# Altium schematic symbol library BARKO_SCHLIB.SchLib: 1064 symbols (part 7 of 11) (continued)
## L-1u1H-7050-744314110
designator L?, comment 1u1H  Max DC Current: 15A
INDUCTOR, POWER, 1.1UH, 20%, 7.3X7.2MM; Manufacturer: Wurth Electronics; Manufacturer Part Number: 744314110; Self Resonant Frequency: 135MHz; Saturation Current: 13A; Shielding: Shielded; DC Resistance (DCR): 3.15mR; Test Frequency: 100kHz; Series Resistance: 3.15R; .Creator: M.OZKAN; .PCBCHK: USED; Supplier 1: Digi-Key; Supplier Part Number 1: 732-1157-1-ND; Stock: 6291; Pricing: 1=3.56, 10=3.494, 50=3.226, 100=3.091, 500=2.89 (USD); RoHS: Yes; Mount: Surface Mount; Case/Package: Nonstandard; Min Operating Temperature: -40°C; Max Operating Temperature: 150°C; Tolerance: 20%; Package Quantity: 1; Current Rating: 15A; Packaging: Tape and Reel; Inductance Tolerance: 20%; Composition: Wirewound; Inductance: 1.1uH; Termination: SMD/SMT; RMS Current (Irms): 15A; Length: 0.272inch; Height: 4.8mm; Width: 6.9mm; Height - Seated (Max): 0.197inch; REACH SVHC: Unknown; Lead Free: Lead Free; ComponentLink1URL: https://datasheet.ciiva.com/1052/744314110-1052001.pdf?src-supplier=Digi-Key; ComponentLink1Description: https://datasheet.ciiva.com/1052/744314110-1052001.pdf?src-supplier=Digi-Key; ComponentLink2URL: https://datasheet.ciiva.com/23782/1645941-23782470.pdf?src-supplier=Newark; ComponentLink2Description: https://datasheet.ciiva.com/23782/1645941-23782470.pdf?src-supplier=Newark; ComponentLink3URL: https://datasheet.ciiva.com/4954/744314110-26271-4954696.pdf?src-supplier=Mouser; ComponentLink3Description: https://datasheet.ciiva.com/4954/744314110-26271-4954696.pdf?src-supplier=Mouser; ComponentLink4URL: https://datasheet.ciiva.com/7765/1735761-7765021.pdf?src-supplier=Element14; ComponentLink4Description: https://datasheet.ciiva.com/7765/1735761-7765021.pdf?src-supplier=Element14; ComponentLink5URL: https://datasheet.ciiva.com/1052/744314110-1052002.pdf?src-supplier=Digi-Key; ComponentLink5Description: https://datasheet.ciiva.com/1052/744314110-1052002.pdf?src-supplier=Digi-Key; ComponentLink6URL: https://datasheet.ciiva.com/1052/744314110-1052003.pdf?src-supplier=Digi-Key; ComponentLink6Description: https://datasheet.ciiva.com/1052/744314110-1052003.pdf?src-supplier=Digi-Key; .SCHCHK: USED
footprint L-WE-HCI-7050 (SMD Inductor, 2-Leads, Body 7.0 x 6.9 mm)
pins: 1, 2

## L-1uH-0420CDMCCDS-1R0MC
designator L?, comment Inductance: 1uH  Case/Package: 1616  Current Rating: 4A  (hidden comment: 0420CDMCCDS-1R0MC)
FIXED IND 1UH 6.5A 27 MOHM; Manufacturer: Vishay Dale; Manufacturer Part Number: IHLP1616ABER1R0M01; Core Material: Metal,Composite,Ferrite; Saturation Current: 7A; Tolerance: 20%; Shielding: Shielded; Self Resonant Frequency: 64MHz; DC Resistance (DCR): 52.5mR; Test Frequency: 100kHz; Max DC Current: 8.5A; Washability: OK; .Creator: M.OZKAN; .PCBCHK: USED; ComponentLink1URL: http://products.sumida.com/products/pdf/0420CDMCCDS1.pdf?src-supplier=Digi-Key; ComponentLink1Description: http://products.sumida.com/products/pdf/0420CDMCCDS1.pdf?src-supplier=Digi-Key; Supplier 1: Digi-Key; Supplier Part Number 1: 541-1043-1-ND; Stock 1: 7197; Pricing 1: 1=2.62000, 10=2.41500, 100=1.69050, 500=1.36850, 1000=1.24775 (USD); RoHS: Yes; Mount: Surface Mount; Number of Pins: 1616; Case Code (Metric): 4040; Case Code (Imperial): 1616; Contact Plating: Tin; Min Operating Temperature: -55°C; Max Operating Temperature: 125°C; Package Quantity: 4000; Packaging: Tape and Reel; Inductance Tolerance: 20%; Termination: SMD/SMT; Military Standard: Not; RMS Current (Irms): 4A; Length: 4.7mm; Height: 1.2mm; Width: 0.16inch; Height - Seated (Max): 0.047inch; Depth: 4.31mm; Radiation Hardening: No; REACH SVHC: Unknown; Lead Free: Lead Free; ComponentLink2URL: https://datasheet.ciiva.com/1051/lp16ab01-1051920.pdf?src-supplier=Digi-Key; ComponentLink2Description: https://datasheet.ciiva.com/1051/lp16ab01-1051920.pdf?src-supplier=Digi-Key; ComponentLink3URL: https://datasheet.ciiva.com/3866/lp16ab01-3866741.pdf?src-supplier=Arrow; ComponentLink3Description: https://datasheet.ciiva.com/3866/lp16ab01-3866741.pdf?src-supplier=Arrow; ComponentLink4URL: https://datasheet.ciiva.com/7290/1748910-7290133.pdf?src-supplier=Newark; ComponentLink4Description: https://datasheet.ciiva.com/7290/1748910-7290133.pdf?src-supplier=Newark; ComponentLink5URL: https://datasheet.ciiva.com/11798/0900766b8102b52a-11798309.pdf?src-supplier=RSComponents; ComponentLink5Description: https://datasheet.ciiva.com/11798/0900766b8102b52a-11798309.pdf?src-supplier=RSComponents; ComponentLink6URL: https://datasheet.ciiva.com/1051/lp16ab01-1051921.pdf?src-supplier=Digi-Key; ComponentLink6Description: https://datasheet.ciiva.com/1051/lp16ab01-1051921.pdf?src-supplier=Digi-Key; ComponentLink7URL: https://datasheet.ciiva.com/1051/lp16ab01-1051922.pdf?src-supplier=Digi-Key; ComponentLink7Description: https://datasheet.ciiva.com/1051/lp16ab01-1051922.pdf?src-supplier=Digi-Key; ComponentLink8URL: https://datasheet.ciiva.com/46430/1856027-46430119.pdf?src-supplier=Element14; ComponentLink8Description: https://datasheet.ciiva.com/46430/1856027-46430119.pdf?src-supplier=Element14; ComponentLink9URL: https://datasheet.ciiva.com/7649/425543-7649737.pdf?src-supplier=Element14; ComponentLink9Description: https://datasheet.ciiva.com/7649/425543-7649737.pdf?src-supplier=Element14; ComponentLink10URL: https://datasheet.ciiva.com/17269/lp16ab01-17269641.pdf?src-supplier=Avnet+Europe; ComponentLink10Description: https://datasheet.ciiva.com/17269/lp16ab01-17269641.pdf?src-supplier=Avnet+Europe; ComponentLink11URL: https://datasheet.ciiva.com/17111/70205424-17111707.pdf?src-supplier=Allied+Electronics; ComponentLink11Description: https://datasheet.ciiva.com/17111/70205424-17111707.pdf?src-supplier=Allied+Electronics; .SCHCHK: USED
footprint L-IHLP1616
pins: 1, 2

## L-1uH-IHLP1616BZER1R0M01
designator L?  Inductance: 1uH  Saturation Current: 8.5A  Case/Package: 1616  (hidden comment: *)
FIXED IND 1UH 3.75A 37 MOHM SMD; Manufacturer: Vishay Dale; Manufacturer Part Number: IHLP1616BZER1R0M01; Core Material: Composite,Ferrite,Metal; Tolerance: 20%; DC Resistance (DCR): 37mR; Self Resonant Frequency: 90MHz; Shielding: Shielded; Test Frequency: 100kHz; .PCBCHK: USED; .Creator: F:TALI; Washability: OK; Supplier 1: Digi-Key; Supplier Part Number 1: 541-1047-6-ND; Stock 1: 11650; Pricing 1: 1=2.65, 10=2.45, 100=1.7147, 500=1.38806, 1000=1.26558 (USD); Mount: Surface Mount; Number of Pins: 2; Contact Plating: Tin; Min Operating Temperature: -55°C; Max Operating Temperature: 125°C; Inductance Tolerance: 20%; Packaging: Tape and Reel; Package Quantity: 1; Termination: SMD/SMT; Military Standard: Not; RMS Current (Irms): 3.75A; Length: 4.7mm; Height: 2mm; Depth: 4.31mm; Width: 4.06mm; Height - Seated (Max): 0.079inch; Radiation Hardening: No; REACH SVHC: Unknown; Lead Free: Lead Free; ComponentLink1URL: http://www.farnell.com/datasheets/425556.pdf; ComponentLink1Description: http://www.farnell.com/datasheets/425556.pdf; ComponentLink2URL: http://www.vishay.com/docs/34195/lp16bz01.pdf; ComponentLink2Description: http://www.vishay.com/docs/34195/lp16bz01.pdf; ComponentLink3URL: http://uk.rs-online.com/webdocs/102c/0900766b8102c92b.pdf; ComponentLink3Description: http://uk.rs-online.com/webdocs/102c/0900766b8102c92b.pdf; Current Rating: 3.75A; Max DC Current: 8.5A; .SCHCHK: USED
footprint L-IHLP1616
pins: 1, 2

## L-1uH-IHLP2020BZER1R0M01
designator L?, comment IHLP2020BZER1R0M01  Max DC Current: 16A  Case/Package: 2020
FIXED IND 1UH 7A 20 MOHM SMD; Manufacturer: Vishay Dale; Core Material: Composite,Ferrite,Metal; Tolerance: 20%; DC Resistance (DCR): 20mR; Shielding: Shielded; Self Resonant Frequency: 62MHz; Test Frequency: 100kHz; .Creator: F:TALI; .PCBCHK: USED; Washability: OK; Supplier 1: Digi-Key; Manufacturer Part Number: IHLP2020BZER1R0M01; Stock 1: 88778; Pricing 1: 1=2.39, 10=2.208, 100=1.5456, 500=1.2512, 1000=1.1408 (USD); Mount: Surface Mount; Number of Pins: 2020; Contact Plating: Tin; Min Operating Temperature: -55°C; Max Operating Temperature: 125°C; Inductance: 1uH; Package Quantity: 2000; Current Rating: 7A; Saturation Current: 16A; Packaging: Tape and Reel; Inductance Tolerance: 20%; Termination: SMD/SMT; Military Standard: Not; RMS Current (Irms): 7A; Length: 5.74mm; Height: 2mm; Depth: 5.43mm; Width: 0.204inch; Height - Seated (Max): 0.079inch; Radiation Hardening: No; REACH SVHC: Unknown; Lead Free: Lead Free; ComponentLink1URL: http://uk.rs-online.com/webdocs/102c/0900766b8102c92d.pdf?src-supplier=RSComponents; ComponentLink1Description: http://uk.rs-online.com/webdocs/102c/0900766b8102c92d.pdf?src-supplier=RSComponents; ComponentLink2URL: http://www.mouser.com/ds/2/427/ihlp-2020bz-01-270737.pdf?src-supplier=Mouser; ComponentLink2Description: http://www.mouser.com/ds/2/427/ihlp-2020bz-01-270737.pdf?src-supplier=Mouser; ComponentLink3URL: http://www.vishay.com/docs/34253/lp20bz01.pdf?src-supplier=Avnet; ComponentLink3Description: http://www.vishay.com/docs/34253/lp20bz01.pdf?src-supplier=Avnet; ComponentLink4URL: http://www.farnell.com/datasheets/2045928.pdf?src-supplier=Element14; ComponentLink4Description: http://www.farnell.com/datasheets/2045928.pdf?src-supplier=Element14; ComponentLink5URL: http://www.vishay.com/docs/34253/lp20bz01.pdf?src-supplier=Future+Electronics; ComponentLink5Description: http://www.vishay.com/docs/34253/lp20bz01.pdf?src-supplier=Future+Electronics; ComponentLink6URL: http://www.farnell.com/datasheets/1854284.pdf?src-supplier=Element14; ComponentLink6Description: http://www.farnell.com/datasheets/1854284.pdf?src-supplier=Element14; ComponentLink7URL: https://www.verical.com/server-webapp/html/getDatasheet?partID=139157&src-supplier=Verical; ComponentLink7Description: https://www.verical.com/server-webapp/html/getDatasheet?partID=139157&src-supplier=Verical; Supplier Part Number 1: 541-1087-6-ND; .SCHCHK: USED
footprint L-IHLP2020BZER1R0M01
pins: 1, 2

## L-2u2H SRP4020FA-2R2M
designator L?, comment RP4020FA-2R2M
FIXED IND 2.2UH 8A 23.5MOHM SMD; Manufacturer: Bourns; Manufacturer Part Number: SRP4020FA-2R2M; Core Material: Ferrite; Tolerance: 20%; Saturation Current: 3.8A; Shielding: Shielded; DC Resistance (DCR): 23.5mR; Self Resonant Frequency: 38MHz; Test Frequency: 100kHz; Supplier 1: Mouser; Stock 1: 153; Pricing 1: 1=1,03000, 10=0,96200, 25=0,88700, 50=0,74000, 100=0,69500, 250=0,62100 (USD); RoHS: No; Mount: Surface Mount; Case/Package: Nonstandard; Min Operating Temperature: -55°C; Max Operating Temperature: 155°C; Composition: Wirewound; Packaging: Cut Tape; Inductance: 2.2uH; Current Rating: 8A; Ratings: AEC-Q200; ComponentLink1URL: https://www.bourns.com/docs/Product-Datasheets/SRP4020FA.pdf?src-supplier=Digi-Key; ComponentLink1Description: https://www.bourns.com/docs/Product-Datasheets/SRP4020FA.pdf?src-supplier=Digi-Key; Supplier Part Number 1: 652-SRP4020FA-2R2M
footprint L-4.1x4.1mm (SRP4020FA-2R2M)
pins: 1, 2

## L-2u2H-0805-A2R2WT
designator L?, comment 2u2H  Current Rating: 650mA  Case/Package: 0805
FIXED IND 2.2UH 650MA 150 MOHM; Manufacturer: TDK; Manufacturer Part Number: MLZ2012A2R2WT000; Core Material: Ferrite; DC Resistance (DCR): 195mR; Self Resonant Frequency: 120MHz; Test Frequency: 10MHz; Tolerance: 20%; Shielding: Shielded; Saturation Current: 210mA; .Creator: M.OZKAN; .PCBCHK: USED; Supplier 1: Digi-Key; Supplier Part Number 1: 445-6393-1-ND; Stock: 2703; Pricing: 1=0.14, 10=0.129, 100=0.0863, 500=0.0719, 1000=0.0604 (USD); RoHS: Yes; Mount: Surface Mount; Case Code (Metric): 2012; Case Code (Imperial): 0805; Min Operating Temperature: -55°C; Max Operating Temperature: 125°C; Inductance: 2.2uH; Packaging: Tape and Reel; Package Quantity: 1; Length: 0.079inch; Height - Seated (Max): 0.041inch; Width: 0.049inch; Lead Free: Lead Free; ComponentLink1URL: https://datasheet.ciiva.com/29698/inductor-commercial-decoupling-mlz-en-29698939.pdf?src-supplier=Digi-Key; ComponentLink1Description: https://datasheet.ciiva.com/29698/inductor-commercial-decoupling-mlz-en-29698939.pdf?src-supplier=Digi-Key; ComponentLink2URL: https://datasheet.ciiva.com/29698/inductor-commercial-decoupling-mlz-en-29698940.pdf?src-supplier=Digi-Key; ComponentLink2Description: https://datasheet.ciiva.com/29698/inductor-commercial-decoupling-mlz-en-29698940.pdf?src-supplier=Digi-Key; ComponentLink3URL: https://datasheet.ciiva.com/29698/inductor-commercial-decoupling-mlz-en-29698941.pdf?src-supplier=Digi-Key; ComponentLink3Description: https://datasheet.ciiva.com/29698/inductor-commercial-decoupling-mlz-en-29698941.pdf?src-supplier=Digi-Key; .SCHCHK: USED
footprint L-0805
pins: 1, 2

## L-2u2H-1273AS-H-2R2N
designator L?, comment 2U2  Manufacturer Part Number: 1273AS-H-2R2N=P3  Max DC Current: 6.5A
FIXED IND 2.2UH 6.5A 13.2 MOHM; Manufacturer: Murata; Core Material: Ferrite; Saturation Current: 6.2A; Shielding: Shielded; DC Resistance (DCR): 13.2mR; Test Frequency: 100kHz; Tolerance: 30%; Washability: OK; .Creator: M.OZKAN; .PCBCHK: USED; ComponentLink1URL: http://www.mouser.com/ds/2/87/bus-elx-ds-10282-hcma0703-462601.pdf?src-supplier=Mouser; ComponentLink1Description: http://www.mouser.com/ds/2/87/bus-elx-ds-10282-hcma0703-462601.pdf?src-supplier=Mouser; ComponentLink2URL: http://www.cooperindustries.com/content/dam/public/bussmann/Electronics/Resources/product-datasheets/bus-elx-ds-10282-hcma0703.pdf?src-supplier=Avnet; ComponentLink2Description: http://www.cooperindustries.com/content/dam/public/bussmann/Electronics/Resources/product-datasheets/bus-elx-ds-10282-hcma0703.pdf?src-supplier=Avnet; Supplier 1: Digi-Key; Supplier Part Number 1: 490-10841-1-ND; Stock: 840; Pricing: 1=0.94, 10=0.826, 100=0.59, 500=0.4956 (USD); RoHS: Yes; Mount: Surface Mount; Case/Package: SMD/SMT; Number of Pins: 2; Packaging: Tape and Reel; Composition: Wirewound; Inductance: 2.2uH; Current Rating: 6.5A; Length: 0.315inch; Height: 3mm; Width: 0.315inch; Height - Seated (Max): 0.118inch; ComponentLink3URL: https://media.digikey.com/pdf/Data%20Sheets/Murata%20PDFs/DEMO80(30,40,45)C%20Type.pdf?src-supplier=Digi-Key; ComponentLink3Description: https://media.digikey.com/pdf/Data%20Sheets/Murata%20PDFs/DEMO80(30,40,45)C%20Type.pdf?src-supplier=Digi-Key; ComponentLink4URL: http://www.toko.co.jp/products/pdf/inductors/dem8030c_dem8040c_dem8045c.pdf?src-supplier=Avnet; ComponentLink4Description: http://www.toko.co.jp/products/pdf/inductors/dem8030c_dem8040c_dem8045c.pdf?src-supplier=Avnet; .SCHCHK: USED
pins: 1, 2

## L-2u2H-7447773022
designator L?, comment 2u2H
FIXED IND 2.2UH 4.8A 17.5mOHM SMD; Manufacturer: Wurth Electronics; Manufacturer Part Number: 7447773022; .Creator: M.OZKAN; .PCBCHK: USED; Supplier 1: Digi-Key; Supplier Part Number 1: 732-13569-1-ND; RoHS: No; Category: Fixed Inductors; Stock: 885; Pricing: 1=2,00000, 10=1,78200, 50=1,62000, 100=1,48500, 500=1,35000 (USD); .SCHCHK: USED
footprint WE-PD_7345P (SMT Shielded Power Inductor, 2-leads, body 7.3x7.4mm)
pins: 1, 2

## L-2u2H-74438357022
designator L?, comment 2u2H  Current Rating: 5.2A
FIXED IND 2.2UH 5.2A 26 MOHM SMD; Manufacturer 1: Wurth Electronics; Manufacturer Part Number: 74438357022; Core Material: Metal,Composite; Tolerance: 20%; Saturation Current: 7A; Shielding: Shielded; DC Resistance (DCR): 26mR; Self Resonant Frequency: 35MHz; Test Frequency: 100kHz; .Creator: M.OZKAN; .PCBCHK: USED; RoHS: No; Category: Fixed Inductors; Stock: 840; Pricing: 1=1,58000, 10=1,50700, 50=1,45200, 100=1,32000 (USD); Mount: Surface Mount; Case/Package: Nonstandard; Min Operating Temperature: -40°C; Max Operating Temperature: 125°C; Packaging: Cut Tape; Inductance: 2.2uH; ComponentLink1URL: http://www.farnell.com/datasheets/2579569.pdf?src-supplier=Farnell; ComponentLink1Description: http://www.farnell.com/datasheets/2579569.pdf?src-supplier=Farnell; ComponentLink2URL: https://katalog.we-online.de/pbs/datasheet/74438357022.pdf?src-supplier=Digi-Key; ComponentLink2Description: https://katalog.we-online.de/pbs/datasheet/74438357022.pdf?src-supplier=Digi-Key; ComponentLink3URL: http://www.farnell.com/datasheets/2579569.pdf?src-supplier=Newark; ComponentLink3Description: http://www.farnell.com/datasheets/2579569.pdf?src-supplier=Newark; Manufacturer 2: Wurth Electronics; Supplier 1: Digi-Key; Supplier Part Number 1: 732-11201-1-ND; .SCHCHK: USED
pins: 1, 2

## L-2u2H-74479299222
designator L?, comment 2u2H  Case/Package: 1210  Current Rating: 2.1A
FIXED IND 2.2UH 2.1A 106 MOHM; Manufacturer: Wurth Electronics; Manufacturer Part Number: 74479299222; Saturation Current: 3.5A; Shielding: Shielded; DC Resistance (DCR): 106mR; Self Resonant Frequency: 25MHz; Test Frequency: 1MHz; Tolerance: 20%; Supplier 1: Digi-Key; Supplier Part Number 1: 732-9728-1-ND; Stock: 4027; Pricing: 1=1.23, 50=1.078, 100=0.935, 1000=0.836 (USD); RoHS: Yes; Mount: Surface Mount; Case Code (Metric): 3225; Case Code (Imperial): 1210; Min Operating Temperature: -40°C; Max Operating Temperature: 125°C; Packaging: Tape and Reel; Inductance: 2.2uH; Inductance Tolerance: 20%; Length: 0.126inch; Width: 0.098inch; Height - Seated (Max): 0.047inch; REACH SVHC: Unknown; ComponentLink1URL: http://www.farnell.com/datasheets/2040044.pdf?src-supplier=Element14; ComponentLink1Description: http://www.farnell.com/datasheets/2040044.pdf?src-supplier=Element14; ComponentLink2URL: https://katalog.we-online.de/pbs/datasheet/74479299222.pdf?src-supplier=Digi-Key; ComponentLink2Description: https://katalog.we-online.de/pbs/datasheet/74479299222.pdf?src-supplier=Digi-Key
footprint WE-PMCI_1210_H1 (Power Molded Chip Inductor, body 3.2x2.5mm)
pins: 1, 2

## L-2u2H-74479887222C
designator L?, comment 2u2H  Current Rating: 1.6A
FIXED IND 2.2UH 1.6A 110 MOHM; Manufacturer 1: Wurth Electronics; Manufacturer Part Number: 74479887222C; Saturation Current: 1.5A; Shielding: Shielded; DC Resistance (DCR): 110mR; Self Resonant Frequency: 40MHz; Test Frequency: 1MHz; Tolerance: 20%; .Creator: M.OZKAN; .PCBCHK: USED; Supplier 1: Digi-Key; Supplier Part Number 1: 732-9690-1-ND; RoHS: Yes; Category: Fixed Inductors; Stock: 5123; Pricing: 1=0,74000, 50=0,60500, 100=0,51700, 1000=0,46201 (USD); Mount: Surface Mount; Case/Package: 1008; Case Code (Metric): 2520; Case Code (Imperial): 1008; Min Operating Temperature: -40°C; Max Operating Temperature: 125°C; Packaging: Tape and Reel; Inductance: 2.2uH; RMS Current (Irms): 1.6A; Inductance Tolerance: 20%; Length: 0.098inch; Width: 0.079inch; Height - Seated (Max): 0.039inch; REACH SVHC: Unknown; ComponentLink1URL: http://www.farnell.com/datasheets/2040006.pdf?src-supplier=Element14; ComponentLink1Description: http://www.farnell.com/datasheets/2040006.pdf?src-supplier=Element14; ComponentLink2URL: http://katalog.we-online.de/pbs/datasheet/74479887222C.pdf?src-supplier=Digi-Key; ComponentLink2Description: http://katalog.we-online.de/pbs/datasheet/74479887222C.pdf?src-supplier=Digi-Key; .SCHCHK: USED
footprint WE-PMI_1008_H1 (Power Multilayer Inductor, body 2.5x2mm)
pins: 1, 2

## L-2u2H-IHLP1212BZER2R2M11
designator L?, comment 2u2H  Case/Package: 1212  Current Rating: 3A
FIXED IND 2.2UH 3A 46 MOHM SMD; Manufacturer: Vishay Dale; Manufacturer Part Number: IHLP1212BZER2R2M11; Core Material: Metal,Composite,Ferrite; Inductance Tolerance: 20%; Self Resonant Frequency: 55MHz; Shielding: Shielded; Saturation Current: 3.3A; DC Resistance (DCR): 46mR; Test Frequency: 100kHz; Supplier 1: Digi-Key; Supplier Part Number 1: 541-1322-1-ND; Stock: 61939; Pricing: 1=1.26, 10=1.17, 25=1.08, 50=0.9, 100=0.846, 250=0.756, 500=0.648, 1000=0.576 (USD); RoHS: Yes; Mount: Surface Mount; Number of Pins: 2; Contact Plating: Tin; Min Operating Temperature: -55°C; Max Operating Temperature: 125°C; Packaging: Tape and Reel; Tolerance: 20%; Package Quantity: 3000; Inductance: 2.2uH; Max DC Current: 3A; Termination: SMD/SMT; RMS Current (Irms): 3A; Length: 3.6mm; Height: 2mm; Width: 3mm; Height - Seated (Max): 0.079inch; Depth: 3.2mm; Radiation Hardening: No; REACH SVHC: Unknown; Lead Free: Lead Free; Military Standard: Not; ComponentLink1URL: https://datasheet.ciiva.com/7290/1537140-7290128.pdf?src-supplier=Newark; ComponentLink1Description: https://datasheet.ciiva.com/7290/1537140-7290128.pdf?src-supplier=Newark; ComponentLink2URL: https://datasheet.ciiva.com/8017/1520470-8017625.pdf?src-supplier=Element14; ComponentLink2Description: https://datasheet.ciiva.com/8017/1520470-8017625.pdf?src-supplier=Element14; ComponentLink3URL: https://datasheet.ciiva.com/11798/0900766b8102b422-11798283.pdf?src-supplier=RSComponents; ComponentLink3Description: https://datasheet.ciiva.com/11798/0900766b8102b422-11798283.pdf?src-supplier=RSComponents; ComponentLink4URL: https://datasheet.ciiva.com/3866/lp12bz11-3866206.pdf?src-supplier=Arrow+Electronics; ComponentLink4Description: https://datasheet.ciiva.com/3866/lp12bz11-3866206.pdf?src-supplier=Arrow+Electronics; ComponentLink5URL: https://datasheet.ciiva.com/16335/lp12bz11-16335797.pdf?src-supplier=Future+Electronics; ComponentLink5Description: https://datasheet.ciiva.com/16335/lp12bz11-16335797.pdf?src-supplier=Future+Electronics; ComponentLink6URL: https://datasheet.ciiva.com/4953/lp12bz11-244380-4953990.pdf?src-supplier=Mouser; ComponentLink6Description: https://datasheet.ciiva.com/4953/lp12bz11-244380-4953990.pdf?src-supplier=Mouser; ComponentLink7URL: https://datasheet.ciiva.com/6688/lp12bz11-6688247.pdf?src-supplier=Digi-Key; ComponentLink7Description: https://datasheet.ciiva.com/6688/lp12bz11-6688247.pdf?src-supplier=Digi-Key; ComponentLink8URL: https://datasheet.ciiva.com/6688/lp12bz11-6688250.pdf?src-supplier=Digi-Key; ComponentLink8Description: https://datasheet.ciiva.com/6688/lp12bz11-6688250.pdf?src-supplier=Digi-Key; ComponentLink9URL: https://datasheet.ciiva.com/6688/lp12bz11-6688252.pdf?src-supplier=Digi-Key; ComponentLink9Description: https://datasheet.ciiva.com/6688/lp12bz11-6688252.pdf?src-supplier=Digi-Key; ComponentLink10URL: https://datasheet.ciiva.com/3081/lp12bz11-3081917.pdf?src-supplier=Avnet; ComponentLink10Description: https://datasheet.ciiva.com/3081/lp12bz11-3081917.pdf?src-supplier=Avnet; ComponentLink11URL: https://datasheet.ciiva.com/17268/lp12bz11-17268765.pdf?src-supplier=Avnet+Europe; ComponentLink11Description: https://datasheet.ciiva.com/17268/lp12bz11-17268765.pdf?src-supplier=Avnet+Europe
footprint L-1212
pins: 1, 2

## L-3.6uH-7447797360
designator L?, comment Current Rating: 8.2A  (hidden comment: 3.6UH)
FIXED IND 3.6UH 8.2A 12.2 MOHM; Manufacturer: Wurth Electronics; Manufacturer Part Number: 7447797360; Core Material: Metal,Composite,Ferrite; Tolerance: 20%; Self Resonant Frequency: 55MHz; Saturation Current: 8.5A; Shielding: Shielded; DC Resistance (DCR): 12.2mR; Test Frequency: 100kHz; Max DC Current: 6.8A; Washability: OK; .Creator: M.OZKAN; .PCBCHK: USED; Supplier 1: Mouser; Stock 1: 829; Pricing 1: 1=2,99000, 10=2,76000, 25=2,76000, 50=2,66000, 100=2,57000, 250=2,28000, 500=1,99000 (USD); RoHS: Yes; Mount: Surface Mount; Case/Package: Nonstandard; Min Operating Temperature: -40°C; Max Operating Temperature: 150°C; Inductance Tolerance: 20%; Package Quantity: 500; Packaging: Cut Tape; Composition: Wirewound; RMS Current (Irms): 8.2A; Length: 0.402inch; Height: 4.5mm; Width: 0.402inch; Height - Seated (Max): 0.177inch; Depth: 10.2mm; REACH SVHC: Unknown; Lead Free: Lead Free; ComponentLink1URL: https://datasheet.ciiva.com/11803/0900766b80d8967d-11803073.pdf?src-supplier=RSComponents; ComponentLink1Description: https://datasheet.ciiva.com/11803/0900766b80d8967d-11803073.pdf?src-supplier=RSComponents; ComponentLink2URL: https://datasheet.ciiva.com/5975/530532-5975586.pdf?src-supplier=Farnell; ComponentLink2Description: https://datasheet.ciiva.com/5975/530532-5975586.pdf?src-supplier=Farnell; ComponentLink3URL: https://datasheet.ciiva.com/1052/7447797360-1052196.pdf?src-supplier=Digi-Key; ComponentLink3Description: https://datasheet.ciiva.com/1052/7447797360-1052196.pdf?src-supplier=Digi-Key; ComponentLink4URL: https://datasheet.ciiva.com/1052/7447797360-1052198.pdf?src-supplier=Digi-Key; ComponentLink4Description: https://datasheet.ciiva.com/1052/7447797360-1052198.pdf?src-supplier=Digi-Key; Supplier Part Number 1: 710-7447797360; .SCHCHK: USED; Inductance: 3.6uH
footprint L- 7447797360
pins: 1, 2

## L-3n6H-CW161009A-3N6J-0603
designator L?, comment 3N6  Current Rating (Amps): 700mA  Package: 0603
FIXED IND 3.6NH 700MA 70MOHM SMD; Manufacturer: Bourns; Manufacturer Part Number: CW161009A-3N6J; .Creator: F:TALI; .PCBCHK: USED; Washability: OK; Supplier 1: Digikey; Stock 1: 1000; Pricing 1: 1=0.23, 10=0.207, 100=0.1423, 500=0.12162, 1000=0.09315 (USD); ComponentLink1URL: http://datasheet.octopart.com/CW161009A-3N6J-Bourns-datasheet-125528217.pdf?src-supplier=Allied+Electronics; ComponentLink1Description: http://datasheet.octopart.com/CW161009A-3N6J-Bourns-datasheet-125528217.pdf?src-supplier=Allied+Electronics; Supplier Part Number 1: CW161009A-3N6JDKR-ND; .SCHCHK: USED
pins: 1, 2

## L-3u3H-6010
designator L?, comment 3.3U  Current Rating: 1.5A  Case/Package: 6010
FIXED IND 3.3UH 1.5A 162 MOHM; Manufacturer: Taiyo Yuden; Manufacturer Part Number: NRS6010T3R3MMGF; Core Material: Ferrite; Saturation Current: 1.6A; Tolerance: 20%; Shielding: Shielded; Self Resonant Frequency: 42MHz; DC Resistance (DCR): 162mR; Test Frequency: 100kHz; Washability: OK; .Creator: M.OZKAN; .PCBCHK: USED; Supplier 1: Digi-Key; Supplier Part Number 1: 587-2559-1-ND; Stock 1: 995; Pricing 1: 1=0.39000, 10=0.35000, 100=0.24070, 500=0.20568 (USD); RoHS: Yes; Mount: Surface Mount; Number of Pins: 2; Case Code (Metric): 6010; Case Code (Imperial): 2304; Min Operating Temperature: -25°C; Max Operating Temperature: 125°C; Packaging: Tape and Reel; Inductance: 3.3uH; Composition: Wirewound; Package Quantity: 1000; Max DC Current: 1.6A; Termination: SMD/SMT; Length: 6mm; Height: 1mm; Width: 0.236inch; Height - Seated (Max): 0.039inch; Depth: 6.2mm; Radiation Hardening: No; Lead Free: Lead Free; Halogen Free: Halogen Free; ComponentLink1URL: https://datasheet.ciiva.com/1056/nrs6010t3r3mmgf-ss-1056144.pdf?src-supplier=Digi-Key; ComponentLink1Description: https://datasheet.ciiva.com/1056/nrs6010t3r3mmgf-ss-1056144.pdf?src-supplier=Digi-Key; ComponentLink2URL: https://datasheet.ciiva.com/8502/nrs6010t3r3mmgf-ss-8502754.pdf?src-supplier=Avnet; ComponentLink2Description: https://datasheet.ciiva.com/8502/nrs6010t3r3mmgf-ss-8502754.pdf?src-supplier=Avnet; ComponentLink3URL: https://datasheet.ciiva.com/25607/0900766b810b3cd2-25607156.pdf?src-supplier=RSComponents; ComponentLink3Description: https://datasheet.ciiva.com/25607/0900766b810b3cd2-25607156.pdf?src-supplier=RSComponents; ComponentLink4URL: https://datasheet.ciiva.com/23806/1749903-23806719.pdf?src-supplier=Newark; ComponentLink4Description: https://datasheet.ciiva.com/23806/1749903-23806719.pdf?src-supplier=Newark; .SCHCHK: USED
footprint L-6010 (2 Leads,  6mm X 6mm)
pins: 1, 2